# Altium footprint library PFC_Stage.PcbLib: 60 footprints (part 3 of 4)
Each footprint in its own frame and in the unit in brackets; x right, y up, seen from the top. Pads: shape width x height; smd on the part's side, far side on the other; paste and mask are expansions set on the pad; w line width, h text height; cw(c..) or ccw(c..) is an arc to the next point about the centre after c.
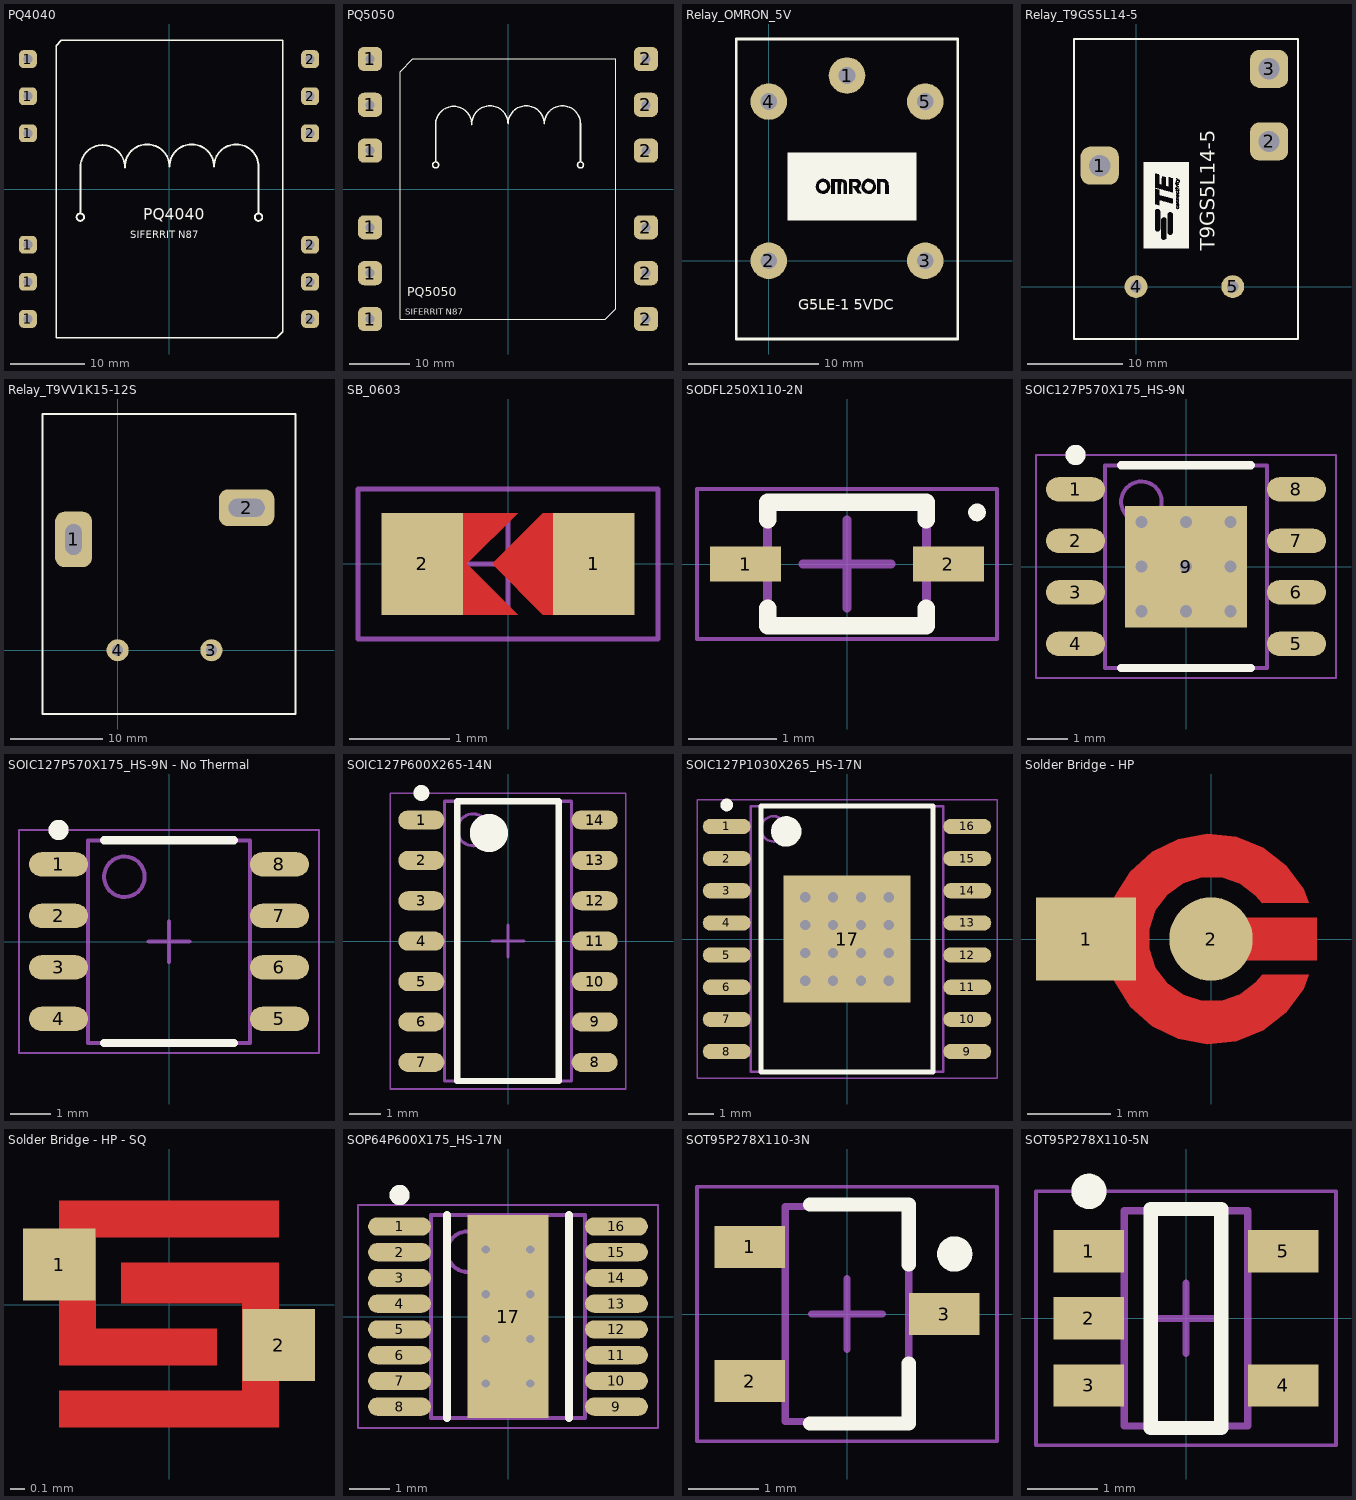
[diagram p2: the footprints below, top view; thin cyan lines are the x and y axes]

## PQ4040 [mm] "Vertica_Bobbin"
pads (12):
  rrect50% 2.4x2.4 hole 1.2: 1(-19,-17.5) 1(-19,-12.5) 1(-19,-7.5) 1(-19,7.5) 1(-19,12.5) 1(-19,17.5) 2(19,-17.5) 2(19,-12.5) 2(19,-7.5) 2(19,7.5) 2(19,12.5) 2(19,17.5)
Top Overlay:
  circle w0.254: c-11.938,-3.79 r0.5
  circle w0.254: c12.062,-3.79 r0.5
  lines w0.2: -15.19,-20 13.894,-20 14.5,-20 15.29,-19.21 15.29,20 -13.794,20 -14.5,20 -15.19,19.31 -15.19,-20
  lines w0.254: -11.938,-3.19 -11.938,2.91 cw(c-8.938,2.91) -5.938,2.91 ; -5.938,3.01 cw(c-2.938,3.01) 0.062,3.01 cw(c3.062,3.01) 6.062,3.01 cw(c9.062,3.01) 12.062,3.01 12.062,-3.19
  text "SIFERRIT N87" at -5.234,-6.611 h1
  text "PQ4040" at -3.459,-4.161 h1.52
3D body "PQ40-40-K-12P-FUAN_zlozenie.STEP": height 43.15, standoff -5.55, extent -21,-20.75 21,20.75

## PQ5050 [mm] "Vertica_Bobbin"
pads (12):
  rrect50% 4x4 hole 1.5: 1(-22.85,-21.55) 1(-22.85,-13.95) 1(-22.85,-6.35) 1(-22.85,6.35) 1(-22.85,13.95) 1(-22.85,21.55) 2(22.85,-21.55) 2(22.85,-13.95) 2(22.85,-6.35) 2(22.85,6.35) 2(22.85,13.95) 2(22.85,21.55)
Top Overlay:
  circle w0.254: c12.012,3.985 r0.5
  circle w0.254: c-11.988,3.985 r0.5
  lines w0.2: -17.85,-21.55 -17.85,19.45 -15.75,21.55 17.85,21.55 17.85,-19.85 16.15,-21.55 -17.85,-21.55
  lines w0.254: -11.988,4.585 -11.988,10.685 cw(c-8.988,10.685) -5.988,10.685 ; -5.988,10.785 cw(c-2.988,10.785) 0.012,10.785 cw(c3.012,10.785) 6.012,10.785 cw(c9.012,10.785) 12.012,10.785 12.012,4.585
  text "PQ5050" at -16.721,-17.746 h1.52
  text "SIFERRIT N87" at -17.046,-20.846 h1
3D body "PQ50-50-K-12P-FUAN_zêo+enie.x_t": height 55.25, standoff -8.75, extent -25.75,-25.5 25.75,25.5

## Relay_OMRON_5V [mm]
pads (5):
  round 2.8 hole 1.3: 1(6,14.2) 2(0,0) 3(12,0) 4(0,12.2) 5(12,12.2)
Top Overlay:
  region: 7.799,5.995 7.898,5.92 7.958,5.81 7.972,5.675 7.952,5.579 7.886,5.469 7.786,5.4 7.668,5.376 7.549,5.405 7.498,5.437 7.407,5.544 7.367,5.673 7.383,5.806 7.39,5.822 7.458,5.94 7.549,6.004 7.668,6.022
  region: 11.317,3.119 1.475,3.119 1.475,5.676 1.475,8.294 11.317,8.294 hole: 6.174,6.262 6.174,5.151 6.396,5.151 6.396,6.04 6.564,6.04 6.694,6.029 6.771,5.995 6.805,5.932 6.809,5.893 6.781,5.801 6.704,5.742 6.584,5.722 6.46,5.722 6.633,5.444 6.806,5.166 6.95,5.157 7.036,5.155 7.087,5.16 7.094,5.165 7.078,5.199 7.036,5.27 6.978,5.358 6.862,5.533 6.946,5.621 7.003,5.709 7.024,5.742 7.054,5.878 7.036,6.014 6.972,6.132 6.893,6.201 6.83,6.231 6.752,6.249 6.642,6.259 6.484,6.262 6.483,6.262 hole: 8.301,6.268 8.301,5.151 8.555,5.151 8.555,6.04 8.696,6.04 8.787,6.035 8.851,6.017 8.894,5.974 8.92,5.899 8.932,5.782 8.936,5.613 8.936,5.545 8.936,5.151 9.19,5.151 9.19,5.533 9.186,5.741 9.172,5.897 9.145,6.014 9.103,6.102 9.043,6.173 9.032,6.182 8.989,6.212 8.93,6.233 8.841,6.246 8.708,6.254 8.631,6.257 hole: 5.255,6.262 4.808,6.262 4.808,5.151 5.062,5.151 5.062,6.04 5.285,6.04 5.285,5.151 5.539,5.151 5.539,5.595 5.539,5.771 5.542,5.893 5.547,5.972 5.558,6.015 5.574,6.035 5.598,6.039 5.6,6.04 5.663,6.026 5.708,5.979 5.738,5.893 5.754,5.76 5.761,5.573 5.761,5.524 5.761,5.151 5.983,5.151 5.983,5.565 5.98,5.788 5.965,5.958 5.931,6.081 5.87,6.166 5.775,6.219 5.638,6.248 5.451,6.26 hole: 7.705,6.283 7.551,6.269 7.406,6.209 7.282,6.11 7.188,5.976 7.135,5.813 7.126,5.709 7.146,5.531 7.21,5.385 7.279,5.297 7.423,5.185 7.586,5.127 7.757,5.128 7.839,5.151 7.846,5.153 7.998,5.242 8.114,5.377 8.185,5.544 8.206,5.706 8.181,5.893 8.105,6.049 8.005,6.157 7.86,6.248 hole: 4.205,6.281 4.047,6.27 3.903,6.213 3.782,6.116 3.69,5.989 3.633,5.84 3.619,5.676 3.654,5.506 3.698,5.41 3.81,5.266 3.952,5.17 4.111,5.126 4.275,5.134 4.434,5.199 4.477,5.229 4.601,5.359 4.677,5.515 4.706,5.683 4.688,5.851 4.626,6.008 4.52,6.141 4.373,6.236 4.278,6.262
  region: 4.223,6.026 4.341,5.968 4.422,5.871 4.461,5.751 4.455,5.623 4.399,5.504 4.366,5.466 4.256,5.393 4.131,5.372 4.011,5.404 4.007,5.407 3.94,5.474 3.885,5.575 3.857,5.683 3.856,5.706 3.882,5.834 3.952,5.939 4.053,6.009 4.169,6.033
  lines w0.2: -2.5,-6 -2.5,17 14.5,17 14.5,-6 -2.5,-6
  text "G5LE-1 5VDC" at 2.254,-3.746 h0.8
3D body "Omron Single.stp": height 19, standoff -3.5, extent -2.45,-5.85 14.45,16.85

## Relay_T9GS5L14-5 [mm]
pads (5):
  rrect50% 4x4 hole 2.24: 1(-3.81,12.7) 2(13.97,15.24) 3(13.97,22.86)
  round 2.4 hole 1.2: 4(0,0) 5(10.16,0)
Top Overlay:
  region: 9 vertices and 19 holes, not listed, extent 0.806,4.044 5.523,13.043
  lines w0.2: -6.5,-5.5 -6.5,26 17,26 17,-5.5 -6.5,-5.5
  text "T9GS5L14-5" at 8.246,3.754 h1.52
3D body "c-1558665-1-b-3d.stp": height 18, standoff -0.95, extent -5.415,-4.29 15.985,24.61

## Relay_T9VV1K15-12S [mm]
pads (4):
  rrect50% 4x6 hole 3.33 slot 1.78 at 0 deg: 1(-4.78,12.01)
  rrect50% 6x4 hole 1.95 slot 3.92 at 0 deg: 2(13.97,15.44)
  round 2.4 hole 1.2: 3(10.16,0) 4(0,0)
Top Overlay:
  lines w0.2: -8.153,-6.909 -8.153,25.603 19.279,25.603 19.279,-6.909 -8.153,-6.909
3D body "c-2027395-5-b-3d.x_t": height 2.16, standoff -22.04, extent -8.151,-6.908 19.278,25.602

## SB_0603 [mil] "Jumper"
height 39.37
pads (2):
  rect 32x40 smd: 1(33.75,0) 2(-33.75,0)
Top Layer:
  region: -26.25,0 -16.25,0 3.75,-20 -26.25,-20
  region: -26.25,0 -16.25,0 3.75,20 -26.25,20
  region: 23.75,20 13.75,20 -6.25,0 13.75,-20 23.75,-20
Top Paste:
  region: 23.75,20 13.75,20 -6.25,0 13.75,-20 23.75,-20
Top Solder:
  region: -53.75,23.99 -53.74,24.01 53.75,24.01 53.75,-24.01 53.72,-24.04 -53.72,-24.04 -53.73,-24.05
Mechanical 15:
  lines w1.97: -18.7,0 18.7,0 ; 0,-18.7 0,18.7 ; -59.06,-29.53 -59.06,29.53 59.06,29.53 59.06,-29.53 -59.06,-29.53

## SODFL250X110-2N [mm] "SODFL, 2-Leads, Body 1.30x2.50mm, IPC Medium Density"
height 1.1
pads (2):
  rect 0.8x0.4 smd: 1(-1.15,0) 2(1.15,0)
Top Overlay:
  circle w0.1: c1.473,0.584 r0.05
  lines w0.2: -0.9,-0.5 -0.9,-0.7 0.9,-0.7 0.9,-0.5 ; -0.9,0.5 -0.9,0.7 0.9,0.7 0.9,0.5
Mechanical 13:
  lines w0.1: -0.9,-0.7 0.9,-0.7 0.9,0.7 -0.9,0.7 -0.9,-0.7
Mechanical 15:
  lines w0.05: -1.7,-0.85 1.7,-0.85 1.7,0.85 -1.7,0.85 -1.7,-0.85
  lines w0.1: -0.5,0 0.5,0 ; 0,-0.5 0,0.5
3D body "SODFL250X110-2N.step": height 1.1, standoff 0, extent -1.25,-0.7 1.25,0.7

## SOIC127P570X175_HS-9N [mm] "SOIC, 8-Leads, Body 4.91x3.90mm, Pitch 1.27mm, Thermal Pad 3.00x3.00mm, IPC Medium Density"
height 1.75
pads (9):
  oval 1.45x0.6 smd: 1(-2.725,1.905) 2(-2.725,0.635) 3(-2.725,-0.635) 4(-2.725,-1.905) 5(2.725,-1.905) 6(2.725,-0.635) 7(2.725,0.635) 8(2.725,1.905)
  rect 3x3 smd: 9(0,0)
via 1.1,-1.1 diameter 0.6 hole 0.3
via 0,-1.1 diameter 0.6 hole 0.3
via -1.1,-1.1 diameter 0.6 hole 0.3
via 1.1,0 diameter 0.6 hole 0.3
via 0,0 diameter 0.6 hole 0.3
via -1.1,0 diameter 0.6 hole 0.3
via 1.1,1.1 diameter 0.6 hole 0.3
via 0,1.1 diameter 0.6 hole 0.3
via -1.1,1.1 diameter 0.6 hole 0.3
Top Overlay:
  circle w0.25: c-2.725,2.755 r0.125
  lines w0.2: -1.6,-2.5 1.6,-2.5 ; -1.6,2.5 1.6,2.5
Mechanical 1:
  text "'.Designator'" at -5.334,-4.493 h1
Mechanical 13:
  circle w0.1: c-1.1,1.6 r0.5
  lines w0.1: -2,-2.5 2,-2.5 2,2.5 -2,2.5 -2,-2.5
Mechanical 15:
  lines w0.05: -3.7,-2.75 3.7,-2.75 3.7,2.75 -3.7,2.75 -3.7,-2.75
  lines w0.1: -0.5,0 0.5,0 ; 0,-0.5 0,0.5
3D body "SOIC127P570X175_HS-9N.step": height 1.75, standoff 0.02, extent -2.767,-2.5 2.767,2.5

## SOIC127P570X175_HS-9N - No Thermal [mm] "SOIC, 8-Leads, Body 4.91x3.90mm, Pitch 1.27mm, Thermal Pad 3.00x3.00mm, IPC Medium Density"
height 1.75
pads (8):
  oval 1.45x0.6 smd: 1(-2.725,1.905) 2(-2.725,0.635) 3(-2.725,-0.635) 4(-2.725,-1.905) 5(2.725,-1.905) 6(2.725,-0.635) 7(2.725,0.635) 8(2.725,1.905)
Top Overlay:
  circle w0.25: c-2.725,2.755 r0.125
  lines w0.2: -1.6,-2.5 1.6,-2.5 ; -1.6,2.5 1.6,2.5
Mechanical 1:
  text "'.Designator'" at -5.334,-4.493 h1
Mechanical 13:
  circle w0.1: c-1.1,1.6 r0.5
  lines w0.1: -2,-2.5 -2,2.5 2,2.5 2,-2.5 -2,-2.5
Mechanical 15:
  lines w0.05: -3.7,-2.75 -3.7,2.75 3.7,2.75 3.7,-2.75 -3.7,-2.75
  lines w0.1: -0.5,0 0.5,0 ; 0,-0.5 0,0.5
3D body "SOIC127P570X175_HS-9N.step": height 1.75, standoff 0.02, extent -2.767,-2.5 2.767,2.5

## SOIC127P600X265-14N [mm] "SOIC, 14-Leads, Body 8.65x3.90mm, Pitch 1.27mm, IPC Medium Density"
height 2.65
pads (14):
  oval 1.45x0.6 smd: 1(-2.725,3.81) 2(-2.725,2.54) 3(-2.725,1.27) 4(-2.725,0) 5(-2.725,-1.27) 6(-2.725,-2.54) 7(-2.725,-3.81) 8(2.725,-3.81) 9(2.725,-2.54) 10(2.725,-1.27) 11(2.725,0) 12(2.725,1.27) 13(2.725,2.54) 14(2.725,3.81)
Top Overlay:
  circle w0.25: c-2.725,4.66 r0.125
  circle w0.6: c-0.6,3.4 r0.3
  lines w0.2: -1.6,-4.4 -1.6,4.4 1.6,4.4 1.6,-4.4 -1.6,-4.4
Mechanical 13:
  circle w0.1: c-1.1,3.5 r0.5
  lines w0.1: -2,-4.4 -2,4.4 2,4.4 2,-4.4 -2,-4.4
Mechanical 15:
  lines w0.05: -3.7,-4.65 -3.7,4.65 3.7,4.65 3.7,-4.65 -3.7,-4.65
  lines w0.1: -0.5,0 0.5,0 ; 0,-0.5 0,0.5
3D body "SOIC127P600X265-14N.step": height 2.65, standoff 0, extent -3,-4.4 3,4.4

## SOIC127P1030X265_HS-17N [mm] "SOIC, 16-Leads, Body 10.30x7.50mm, Pitch 1.27mm, Thermal Pad 5.00x5.00mm, IPC Medium Density"
height 2.65
pads (17):
  oval 1.9x0.6 smd: 1(-4.75,4.445) 2(-4.75,3.175) 3(-4.75,1.905) 4(-4.75,0.635) 5(-4.75,-0.635) 6(-4.75,-1.905) 7(-4.75,-3.175) 8(-4.75,-4.445) 9(4.75,-4.445) 10(4.75,-3.175) 11(4.75,-1.905) 12(4.75,-0.635) 13(4.75,0.635) 14(4.75,1.905) 15(4.75,3.175) 16(4.75,4.445)
  rect 5x5 smd: 17(0,0)
via 1.65,-1.65 diameter 0.8 hole 0.4
via 0.55,-1.65 diameter 0.8 hole 0.4
via -0.55,-1.65 diameter 0.8 hole 0.4
via -1.65,-1.65 diameter 0.8 hole 0.4
via 1.65,-0.55 diameter 0.8 hole 0.4
via 0.55,-0.55 diameter 0.8 hole 0.4
via -0.55,-0.55 diameter 0.8 hole 0.4
via -1.65,-0.55 diameter 0.8 hole 0.4
via 1.65,0.55 diameter 0.8 hole 0.4
via 0.55,0.55 diameter 0.8 hole 0.4
via -0.55,0.55 diameter 0.8 hole 0.4
via -1.65,0.55 diameter 0.8 hole 0.4
via 1.65,1.65 diameter 0.8 hole 0.4
via 0.55,1.65 diameter 0.8 hole 0.4
via -0.55,1.65 diameter 0.8 hole 0.4
via -1.65,1.65 diameter 0.8 hole 0.4
Top Overlay:
  circle w0.6: c-2.4,4.25 r0.3
  circle w0.25: c-4.75,5.295 r0.125
  lines w0.2: -3.4,-5.25 3.4,-5.25 3.4,5.25 -3.4,5.25 -3.4,-5.25
Mechanical 13:
  circle w0.1: c-2.9,4.35 r0.5
  lines w0.1: -3.8,-5.25 3.8,-5.25 3.8,5.25 -3.8,5.25 -3.8,-5.25
Mechanical 15:
  lines w0.05: -5.925,-5.5 5.925,-5.5 5.925,5.5 -5.925,5.5 -5.925,-5.5
  lines w0.1: -0.5,0 0.5,0 ; 0,-0.5 0,0.5
3D body "SOIC127P1030X265_HS-17N.step": height 2.65, standoff 0, extent -5.15,-5.25 5.15,5.25

## Solder Bridge - HP [mm]
pads (2):
  rect 1.2x1 smd: 1(-1.5,0)
  round 1 smd: 2(0,0)
Top Layer:
  region: 0,-0.254 0,0.254 1.27,0.254 1.27,-0.254
  region: 1.173,-0.432 1.112,-0.596 0.905,-0.88 0.628,-1.095 0.303,-1.225 -0.046,-1.261 -0.392,-1.2 -0.707,-1.046 -0.967,-0.811 -1.153,-0.513 -1.25,-0.176 -1.25,0.175 -1.154,0.512 -0.968,0.81 -0.708,1.045 -0.393,1.2 -0.048,1.261 0.301,1.226 0.627,1.095 0.904,0.881 1.112,0.598 1.173,0.433 0.614,0.43 0.539,0.522 0.35,0.663 0.126,0.739 -0.11,0.742 -0.335,0.671 -0.527,0.533 -0.667,0.343 -0.741,0.118 -0.741,-0.118 -0.667,-0.343 -0.527,-0.533 -0.335,-0.671 -0.11,-0.742 0.126,-0.739 0.35,-0.663 0.539,-0.522 0.614,-0.43
Top Solder:
  region: 0,-1.5 -0.148,-1.5 -0.438,-1.442 -0.711,-1.329 -0.956,-1.165 -1.165,-0.956 -1.329,-0.711 -1.442,-0.438 -1.5,-0.148 -1.5,0 -1.5,0.148 -1.442,0.438 -1.329,0.711 -1.165,0.956 -0.956,1.165 -0.711,1.329 -0.438,1.442 -0.148,1.5 0,1.5 0.148,1.5 0.438,1.442 0.711,1.329 0.956,1.165 1.165,0.956 1.329,0.711 1.442,0.438 1.5,0.148 1.5,0 1.5,-0.148 1.442,-0.438 1.329,-0.711 1.165,-0.956 0.956,-1.165 0.711,-1.329 0.438,-1.442 0.148,-1.5

## Solder Bridge - HP - SQ [mm]
pads (2):
  rect 0.5x0.5 smd: 1(-0.762,0.279) 2(0.762,-0.279)
Top Layer:
  region: -0.762,-0.851 -0.762,-0.597 0.508,-0.597 0.508,0.013 -0.33,0.013 -0.33,0.292 0.762,0.292 0.762,-0.851
  region: -0.762,-0.419 -0.762,0.724 0.762,0.724 0.762,0.47 -0.508,0.47 -0.508,-0.165 0.33,-0.165 0.33,-0.419
Top Solder:
  region: -1.041,0.749 -1.041,-0.876 1.041,-0.876 1.041,0.749

## SOP64P600X175_HS-17N [mm] "SOP, 16-Leads, Body 4.91x3.90mm, Pitch 0.64mm, Thermal Pad 5.00x2.00mm, IPC Medium Density"
height 1.75
pads (17):
  oval 1.55x0.45 smd: 1(-2.675,2.222) 2(-2.675,1.587) 3(-2.675,0.953) 4(-2.675,0.318) 5(-2.675,-0.318) 6(-2.675,-0.953) 7(-2.675,-1.587) 8(-2.675,-2.222) 9(2.675,-2.222) 10(2.675,-1.587) 11(2.675,-0.953) 12(2.675,-0.318) 13(2.675,0.318) 14(2.675,0.953) 15(2.675,1.587) 16(2.675,2.222)
  rect 2x5 smd: 17(0,0)
via -0.55,1.65 diameter 0.5 hole 0.2
via 0.55,1.65 diameter 0.5 hole 0.2
via -0.55,0.55 diameter 0.5 hole 0.2
via 0.55,0.55 diameter 0.5 hole 0.2
via -0.55,-0.55 diameter 0.5 hole 0.2
via 0.55,-0.55 diameter 0.5 hole 0.2
via -0.55,-1.65 diameter 0.5 hole 0.2
via 0.55,-1.65 diameter 0.5 hole 0.2
Top Overlay:
  circle w0.25: c-2.675,2.997 r0.125
  lines w0.2: -1.5,-2.5 -1.5,2.5 ; 1.5,-2.5 1.5,2.5
Mechanical 13:
  circle w0.1: c-1,1.6 r0.5
  lines w0.1: -1.9,-2.5 -1.9,2.5 1.9,2.5 1.9,-2.5 -1.9,-2.5
Mechanical 15:
  lines w0.05: -3.7,-2.75 -3.7,2.75 3.7,2.75 3.7,-2.75 -3.7,-2.75
  lines w0.1: -0.5,0 0.5,0 ; 0,-0.5 0,0.5
3D body "SOP64P600X175_HS-17N.step": height 1.75, standoff 0, extent -2.997,-2.5 2.997,2.5

## SOT95P278X110-3N [mm] "SOT23, 3-Leads, Body 2.90x2.78mm, Pitch 0.95mm, IPC Medium Density"
height 1.1
pads (3):
  rect 1x0.6 smd: 1(-1.375,0.95) 2(-1.375,-0.95) 3(1.375,0)
Top Overlay:
  circle w0.25: c1.525,0.85 r0.125
  lines w0.2: -0.525,-1.55 0.875,-1.55 0.875,-0.7 ; -0.525,1.55 0.875,1.55 0.875,0.7
Mechanical 13:
  lines w0.1: -0.875,-1.525 0.875,-1.525 0.875,1.525 -0.875,1.525 -0.875,-1.525
Mechanical 15:
  lines w0.05: -2.125,-1.8 2.125,-1.8 2.125,1.8 -2.125,1.8 -2.125,-1.8
  lines w0.1: -0.5,0 0.5,0 ; 0,-0.5 0,0.5
3D body "SOT95P278X110-3N.step": height 1.1, standoff 0, extent -1.525,-1.525 1.525,1.525

## SOT95P278X110-5N [mm] "SOT23, 5-Leads, Body 2.90x2.78mm, Pitch 0.95mm, IPC Medium Density"
height 1.1
pads (5):
  rect 1x0.6 smd: 1(-1.375,0.95) 2(-1.375,0) 3(-1.375,-0.95) 4(1.375,-0.95) 5(1.375,0.95)
Top Overlay:
  circle w0.25: c-1.375,1.8 r0.125
  lines w0.2: -0.5,-1.55 -0.5,1.55 0.5,1.55 0.5,-1.55 -0.5,-1.55
Mechanical 13:
  lines w0.1: -0.875,-1.525 0.875,-1.525 0.875,1.525 -0.875,1.525 -0.875,-1.525
Mechanical 15:
  lines w0.05: -2.125,-1.8 2.125,-1.8 2.125,1.8 -2.125,1.8 -2.125,-1.8
  lines w0.1: -0.5,0 0.5,0 ; 0,-0.5 0,0.5
3D body "SOT95P278X110-5N.step": height 1.1, standoff 0, extent -1.525,-1.525 1.525,1.525